# Altium footprint library AD_Lib.PcbLib: 508 footprints (part 6 of 32)
Each footprint in its own frame and in the unit in brackets; x right, y up, seen from the top. Pads: shape width x height; smd on the part's side, far side on the other; paste and mask are expansions set on the pad; w line width, h text height; cw(c..) or ccw(c..) is an arc to the next point about the centre after c.
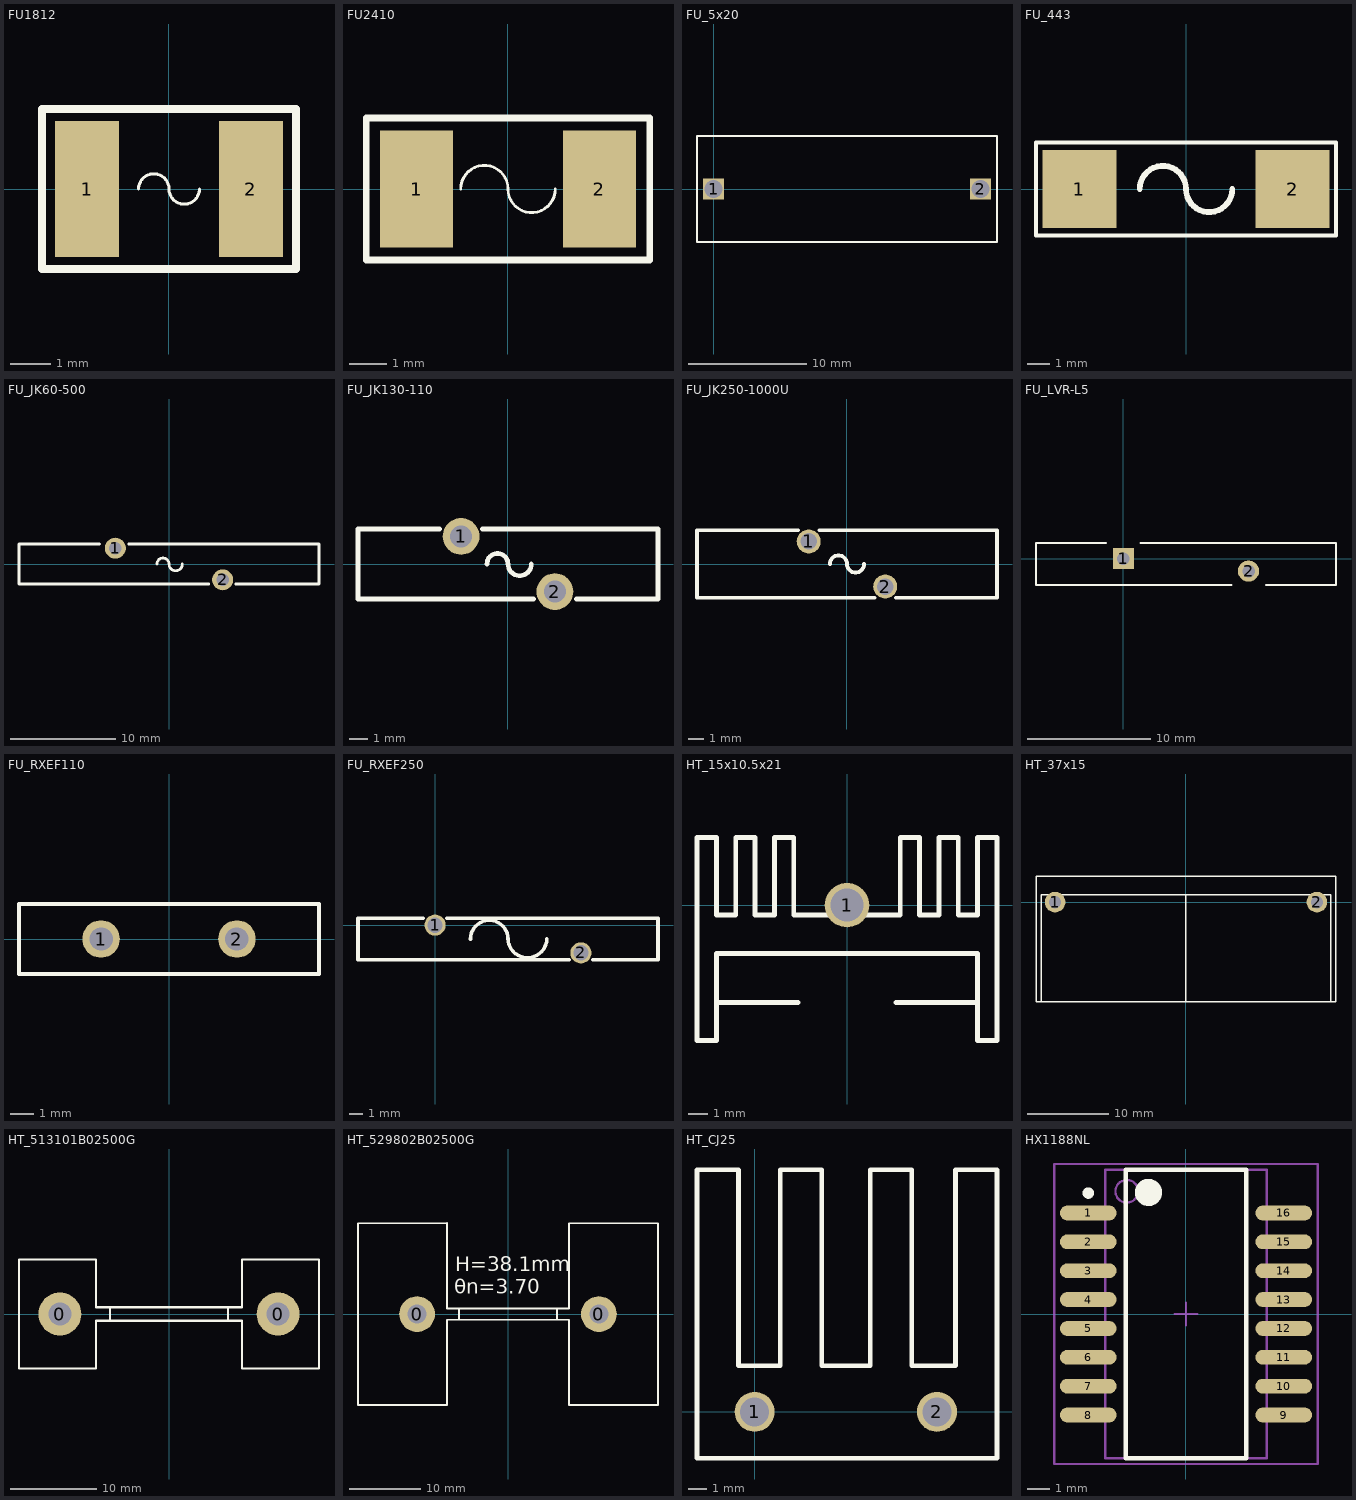
[diagram p5: the footprints below, top view; thin cyan lines are the x and y axes]

## FU1812 [mm] "公制4832；英制1812；功率1/2W"
height 0.7
pads (2):
  rect 1.6x3.4 smd: 1(-2.05,0) 2(2.05,0)
Top Overlay:
  lines w0.076: -0.762,0 cw(c-0.381,0) 0,0 ccw(c0.381,0) 0.762,0
  lines w0.2: -3.175,-2 3.175,-2 3.175,2 -3.175,2 -3.175,-2

## FU2410 [mil] "LittleFuse, 0448 series"
height 106
pads (2):
  rect 77x124 smd: 1(-96.5,0) 2(96.5,0)
Top Overlay:
  lines w3: -50,0 cw(c-25,0) 0,0 ccw(c25,0) 50,0
  lines w7: -149.81,-75 149.81,-75 149.81,75 -149.81,75 -149.81,-75

## FU_5x20 [mm] "玻璃管保险丝底座，5*20mm"
height 13.5
pads (2):
  rect 1.8x1.8 hole 1.5: 1(0,0) 2(22.6,0)
Top Overlay:
  lines w0.152: -1.397,-4.5 24.003,-4.5 24.003,4.5 -1.397,4.5 -1.397,-4.5

## FU_443 [mm] "LittleFuse, 443 series"
height 3.05
pads (2):
  rect 3.25x3.43 smd: 1(-4.675,0) 2(4.675,0)
Top Overlay:
  lines w0.178: -6.58,-2.032 6.58,-2.032 6.58,2.032 -6.58,2.032 -6.58,-2.032
  lines w0.254: -2.032,0 cw(c-1.016,0) 0,0 ccw(c1.016,0) 2.032,0

## FU_JK60-500 [mm] "金科之JK60系列，JK60-500"
height 33.5
pads (2):
  round 2 hole 1.2: 1(-5.1,1.5) 2(5.1,-1.5)
Top Overlay:
  lines w0.254: -6.604,1.9 -14.25,1.9 -14.25,-1.9 3.784,-1.9 ; -3.81,1.9 14.25,1.9 14.25,-1.9 6.35,-1.9 ; -1.143,0 cw(c-0.572,0) 0,0 ccw(c0.635,0) 1.27,0

## FU_JK130-110 [mm] "金科之JK130系列，JK130-110"
height 21.3
pads (2):
  round 2 hole 1.2: 1(-2.55,1.5) 2(2.55,-1.5)
Top Overlay:
  lines w0.254: -3.714,1.9 -8.15,1.9 -8.15,-1.9 1.386,-1.9 ; -1.386,1.9 8.128,1.9 ; -1.143,0 cw(c-0.572,0) 0,0 ccw(c0.635,0) 1.27,0 ; 3.714,-1.9 8.15,-1.9 8.15,1.9

## FU_JK250-1000U [mm] "金科JK250系列之PTC，JK250-1000U"
height 22.5
pads (2):
  round 1.6 hole 1.1: 1(-2.55,1.5) 2(2.55,-1.5)
Top Overlay:
  lines w0.254: -3.256,2.25 -10,2.25 -10,-2.25 1.844,-2.25 ; -1.843,2.25 10,2.25 10,-2.25 3.256,-2.25 ; -1.143,0 cw(c-0.572,0) 0,0 ccw(c0.572,0) 1.143,0

## FU_LVR-L5 [mil] "TE之LVR系列PPTC"
height 1330.71
pads (2):
  rect 68x68 hole 40: 1(0,0)
  round 68 hole 40: 2(400,-40)
Top Overlay:
  lines w6: -55,50 -280,50 -280,-85 345,-85 ; 55,50 680,50 680,-85 455,-85

## FU_RXEF110 [mm] "LittelFuse之PPTC，RXEF110"
height 17.78
pads (2):
  round 1.6 hole 1: 1(-2.9,0) 2(2.9,0)
Top Overlay:
  lines w0.178: -6.4,-1.5 -6.4,1.5 6.4,1.5 6.4,-1.5 -6.4,-1.5

## FU_RXEF250 [mil] "LittelFuse之PPTC，RXEF250"
height 700
pads (2):
  round 60 hole 43.31: 1(0,0) 2(413.4,-78.74)
Top Overlay:
  lines w10: -33.77,19.68 -218.5,19.68 -218.5,-98.43 379.63,-98.43 ; 33.77,19.68 631.9,19.68 631.9,-98.43 447.17,-98.43 ; 100.4,-39.37 cw(c153.55,-39.37) 206.7,-39.37 ; 206.7,-38.87 ccw(c261.8,-37.39) 316.9,-38.87

## HT_15x10.5x21 [mm] "H型散热片，JLC物料号C4649"
height 21
pads (1):
  round 2.3 hole 1.7: 1(0,0)
Top Overlay:
  lines w0.254: -6.75,-5.04 -2.54,-5.04 ; 2.54,-5.04 6.75,-5.04 ; -7.75,-7 -6.75,-7 -6.75,-2.5 6.75,-2.5 6.75,-7 7.75,-7 7.75,3.5 6.75,3.5 6.75,-0.5 5.75,-0.5 5.75,3.5 4.75,3.5 4.75,-0.5 3.75,-0.5 3.75,3.5 2.75,3.5 2.75,-0.5 -2.75,-0.5 -2.75,3.5 -3.75,3.5 -3.75,-0.5 -4.75,-0.5 -4.75,3.5 -5.75,3.5 -5.75,-0.5 -6.75,-0.5 -6.75,3.5 -7.75,3.5 -7.75,-7

## HT_37x15 [mm] "散热片,Rth="
height 11.6
pads (2):
  round 2.54 hole 1.524: 1(-16.15,0) 2(16.15,0)
Top Overlay:
  lines w0.178: -18.5,3.2 -18.5,-12.3 18.5,-12.3 18.5,3.2 -18.463,3.2 ; -17.822,-12.3 -17.822,0.9 17.865,0.9 17.865,-12.3 ; 0,-12.3 0,0.9

## HT_513101B02500G [mm] "散热片"
pads (2):
  round 5 hole 2.67: 0(-12.7,0) 0(12.7,0)
Top Overlay:
  lines w0.254: -6.86,-0.785 -6.86,0.785 ; 6.86,-0.785 6.86,0.785 ; -17.46,-6.35 -17.46,6.35 -8.51,6.35 -8.51,0.785 8.51,0.785 8.51,6.35 17.46,6.35 17.46,-6.35 8.51,-6.35 8.51,-0.785 -8.482,-0.785 -8.51,-0.813 -8.51,-6.35 -17.46,-6.35

## HT_529802B02500G [mm] "散热片"
pads (2):
  round 5 hole 2.67: 0(-12.7,0) 0(12.7,0)
Top Overlay:
  lines w0.254: -8.51,12.7 -20.955,12.7 -20.955,-12.7 -8.51,-12.7 -8.51,-0.813 -8.482,-0.785 8.51,-0.785 8.51,-12.7 20.955,-12.7 20.955,12.7 8.51,12.7 8.51,0.762 ; -8.51,12.723 -8.51,0.785 8.51,0.785 ; -6.86,-0.785 -6.86,0.785 ; 6.86,-0.785 6.86,0.785
  text "θn=3.70" at -7.493,2.159 h3.5
  text "H=38.1mm" at -7.366,5.283 h3.5

## HT_CJ25 [mm]
height 1.75
pads (2):
  round 2.2 hole 1.6: 1(0,0) 2(10.033,0)
Top Overlay:
  lines w0.254: -3.175,-2.55 13.335,-2.55 13.335,13.325 11.049,13.325 11.049,2.53 8.636,2.53 8.636,13.325 6.35,13.325 6.35,2.53 3.683,2.53 3.683,13.325 1.397,13.325 1.397,2.53 -0.889,2.53 -0.889,13.325 -1.905,13.325 -3.175,13.325 -3.175,-2.55

## HX1188NL [mm] "SOP, 16-Leads, Body 12.7x7.1mm (max), Pitch 1.2"
height 5.97
pads (16):
  oval 2.5x0.65 smd: 1(-4.3,4.445) 2(-4.3,3.175) 3(-4.3,1.905) 4(-4.3,0.635) 5(-4.3,-0.635) 6(-4.3,-1.905) 7(-4.3,-3.175) 8(-4.3,-4.445) 9(4.3,-4.445) 10(4.3,-3.175) 11(4.3,-1.905) 12(4.3,-0.635) 13(4.3,0.635) 14(4.3,1.905) 15(4.3,3.175) 16(4.3,4.445)
Top Overlay:
  circle w0.6: c-1.65,5.35 r0.3
  circle w0.25: c-4.3,5.32 r0.125
  lines w0.2: -2.65,-6.35 2.65,-6.35 2.65,6.35 -2.65,6.35 -2.65,-6.35
Mechanical 13:
  circle w0.1: c-2.605,5.4 r0.5
  lines w0.1: -3.555,-6.35 3.555,-6.35 3.555,6.35 -3.555,6.35 -3.555,-6.35
Mechanical 15:
  lines w0.1: -0.5,0 0.5,0 ; 0,-0.5 0,0.5 ; -5.8,-6.6 5.8,-6.6 5.8,6.6 -5.8,6.6 -5.8,-6.6
3D body: height 5.97, standoff 0.25, extent -3.555,-6.35 3.555,6.35